# Altium footprint library MYLIB.PcbLib: 600 footprints (part 4 of 39) (continued)
## CP_56_1 [mil] (continued)
  text "*" at -150,112.8 h50
Mechanical 15:
  region: -141.95,-167.5 -167.5,-167.5 -167.5,-141.95 -179.5,-141.95 -179.5,141.95 -167.5,141.95 -167.5,167.5 -141.95,167.5 -141.95,179.5 141.95,179.5 141.95,167.5 167.5,167.5 167.5,141.95 179.5,141.95 179.5,-141.95 167.5,-141.95 167.5,-167.5 141.95,-167.5 141.95,-179.5 -141.95,-179.5
  lines w6: -179.5,-141.95 -167.5,-141.95 -167.5,-167.5 -141.95,-167.5 -141.95,-179.5 141.95,-179.5 141.95,-167.5 167.5,-167.5 167.5,-141.95 179.5,-141.95 179.5,141.95 167.5,141.95 167.5,167.5 141.95,167.5 141.95,179.5 -141.95,179.5 -141.95,167.5 -167.5,167.5 -167.5,141.95 -179.5,141.95 -179.5,-141.95
3D body: height 10, standoff 0, extent 0,0 10,10

## CP_56_1-L [mil]
pads (57):
  rect 28x8 smd paste+0 mask+0: 1(-151.5,127.95) 2(-151.5,108.27) 3(-151.5,88.58) 4(-151.5,68.9) 5(-151.5,49.21) 6(-151.5,29.53) 7(-151.5,9.84) 8(-151.5,-9.84) 9(-151.5,-29.53) 10(-151.5,-49.21) 11(-151.5,-68.9) 12(-151.5,-88.58) 13(-151.5,-108.27) 14(-151.5,-127.95) 29(151.5,-127.95) 30(151.5,-108.27) 31(151.5,-88.58) 32(151.5,-68.9) 33(151.5,-49.21) 34(151.5,-29.53) 35(151.5,-9.84) 36(151.5,9.84) 37(151.5,29.53) 38(151.5,49.21) 39(151.5,68.9) 40(151.5,88.58) 41(151.5,108.27) 42(151.5,127.95)
  rect 8x28 smd paste+0 mask+0: 15(-127.95,-151.5) 16(-108.27,-151.5) 17(-88.58,-151.5) 18(-68.9,-151.5) 19(-49.21,-151.5) 20(-29.53,-151.5) 21(-9.84,-151.5) 22(9.84,-151.5) 23(29.53,-151.5) 24(49.21,-151.5) 25(68.9,-151.5) 26(88.58,-151.5) 27(108.27,-151.5) 28(127.95,-151.5) 43(127.95,151.5) 44(108.27,151.5) 45(88.58,151.5) 46(68.9,151.5) 47(49.21,151.5) 48(29.53,151.5) 49(9.84,151.5) 50(-9.84,151.5) 51(-29.53,151.5) 52(-49.21,151.5) 53(-68.9,151.5) 54(-88.58,151.5) 55(-108.27,151.5) 56(-127.95,151.5)
  rect 220x220 smd paste-122.5 mask+0: 57(0,0)
Top Overlay:
  region: -2.34,175.5 -17.34,175.5 -17.34,185.5 -2.34,185.5
  region: 175.5,96.08 185.5,96.08 185.5,81.08 175.5,81.08
  region: 175.5,-100.77 185.5,-100.77 185.5,-115.77 175.5,-115.77
  region: -22.03,-175.5 -37.03,-175.5 -37.03,-185.5 -22.03,-185.5
  region: -175.5,-41.71 -185.5,-41.71 -185.5,-56.71 -175.5,-56.71
  lines w6: -162.5,-145.05 -162.5,-162.5 -145.05,-162.5 ; -162.5,145.05 -162.5,162.5 -145.05,162.5 ; 145.05,-162.5 162.5,-162.5 162.5,-145.05 ; 145.05,162.5 162.5,162.5 162.5,145.05
  text "*" at -203,112.8 h50
Top Paste:
  region: 119.06,-65.44 65.44,-65.44 65.44,-119.06 119.06,-119.06
  region: 119.06,-3.94 65.44,-3.94 65.44,-57.56 119.06,-57.56
  region: 119.06,57.56 65.44,57.56 65.44,3.94 119.06,3.94
  region: 119.06,119.06 65.44,119.06 65.44,65.44 119.06,65.44
  region: 57.56,-65.44 3.94,-65.44 3.94,-119.06 57.56,-119.06
  region: 57.56,-3.94 3.94,-3.94 3.94,-57.56 57.56,-57.56
  region: 57.56,57.56 3.94,57.56 3.94,3.94 57.56,3.94
  region: 57.56,119.06 3.94,119.06 3.94,65.44 57.56,65.44
  region: -3.94,-65.44 -57.56,-65.44 -57.56,-119.06 -3.94,-119.06
  region: -3.94,-3.94 -57.56,-3.94 -57.56,-57.56 -3.94,-57.56
  region: -3.94,57.56 -57.56,57.56 -57.56,3.94 -3.94,3.94
  region: -3.94,119.06 -57.56,119.06 -57.56,65.44 -3.94,65.44
  region: -65.44,-65.44 -119.06,-65.44 -119.06,-119.06 -65.44,-119.06
  region: -65.44,-3.94 -119.06,-3.94 -119.06,-57.56 -65.44,-57.56
  region: -65.44,57.56 -119.06,57.56 -119.06,3.94 -65.44,3.94
  region: -65.44,119.06 -119.06,119.06 -119.06,65.44 -65.44,65.44
Mechanical 5:
  region: 184.5,-184.5 -184.5,-184.5 -184.5,184.5 184.5,184.5
Mechanical 13:
  lines w1: -157.5,107.5 -107.5,157.5 ; -157.5,-157.5 -157.5,157.5 157.5,157.5 157.5,-157.5 -157.5,-157.5 ; -157.5,-133.95 -157.5,-121.95 -157.5,-133.95 ; -157.5,-114.27 -157.5,-102.27 -157.5,-114.27 ; -157.5,-94.58 -157.5,-82.58 -157.5,-94.58 ; -157.5,-74.9 -157.5,-62.9 -157.5,-74.9 ; -157.5,-55.21 -157.5,-43.21 -157.5,-55.21 ; -157.5,-35.53 -157.5,-23.53 -157.5,-35.53 ; -157.5,-15.84 -157.5,-3.84 -157.5,-15.84 ; -157.5,3.84 -157.5,15.84 -157.5,3.84 ; -157.5,23.53 -157.5,35.53 -157.5,23.53 ; -157.5,43.21 -157.5,55.21 -157.5,43.21 ; -157.5,62.9 -157.5,74.9 -157.5,62.9 ; -157.5,82.58 -157.5,94.58 -157.5,82.58 ; -157.5,102.27 -157.5,114.27 -157.5,102.27 ; -157.5,121.95 -157.5,133.95 -157.5,121.95 ; -133.95,-157.5 -121.95,-157.5 -133.95,-157.5 ; -133.95,157.5 -121.95,157.5 -133.95,157.5 ; -114.27,-157.5 -102.27,-157.5 -114.27,-157.5 ; -114.27,157.5 -102.27,157.5 -114.27,157.5 ; -94.58,-157.5 -82.58,-157.5 -94.58,-157.5 ; -94.58,157.5 -82.58,157.5 -94.58,157.5 ; -74.9,-157.5 -62.9,-157.5 -74.9,-157.5 ; -74.9,157.5 -62.9,157.5 -74.9,157.5 ; -55.21,-157.5 -43.21,-157.5 -55.21,-157.5 ; -55.21,157.5 -43.21,157.5 -55.21,157.5 ; -35.53,-157.5 -23.53,-157.5 -35.53,-157.5 ; -35.53,157.5 -23.53,157.5 -35.53,157.5 ; -15.84,-157.5 -3.84,-157.5 -15.84,-157.5 ; -15.84,157.5 -3.84,157.5 -15.84,157.5 ; 3.84,-157.5 15.84,-157.5 3.84,-157.5 ; 3.84,157.5 15.84,157.5 3.84,157.5 ; 23.53,-157.5 35.53,-157.5 23.53,-157.5 ; 23.53,157.5 35.53,157.5 23.53,157.5 ; 43.21,-157.5 55.21,-157.5 43.21,-157.5 ; 43.21,157.5 55.21,157.5 43.21,157.5 ; 62.9,-157.5 74.9,-157.5 62.9,-157.5 ; 62.9,157.5 74.9,157.5 62.9,157.5 ; 82.58,-157.5 94.58,-157.5 82.58,-157.5 ; 82.58,157.5 94.58,157.5 82.58,157.5 ; 102.27,-157.5 114.27,-157.5 102.27,-157.5 ; 102.27,157.5 114.27,157.5 102.27,157.5 ; 121.95,-157.5 133.95,-157.5 121.95,-157.5 ; 121.95,157.5 133.95,157.5 121.95,157.5 ; 157.5,-133.95 157.5,-121.95 157.5,-133.95 ; 157.5,-114.27 157.5,-102.27 157.5,-114.27 ; 157.5,-94.58 157.5,-82.58 157.5,-94.58 ; 157.5,-74.9 157.5,-62.9 157.5,-74.9 ; 157.5,-55.21 157.5,-43.21 157.5,-55.21 ; 157.5,-35.53 157.5,-23.53 157.5,-35.53 ; 157.5,-15.84 157.5,-3.84 157.5,-15.84 ; 157.5,3.84 157.5,15.84 157.5,3.84 ; 157.5,23.53 157.5,35.53 157.5,23.53 ; 157.5,43.21 157.5,55.21 157.5,43.21 ; 157.5,62.9 157.5,74.9 157.5,62.9 ; 157.5,82.58 157.5,94.58 157.5,82.58 ; 157.5,102.27 157.5,114.27 157.5,102.27 ; 157.5,121.95 157.5,133.95 157.5,121.95
  text "*" at -150,112.8 h50
Mechanical 15:
  region: -135.95,-161.5 -161.5,-161.5 -161.5,-135.95 -169.5,-135.95 -169.5,135.95 -161.5,135.95 -161.5,161.5 -135.95,161.5 -135.95,169.5 135.95,169.5 135.95,161.5 161.5,161.5 161.5,135.95 169.5,135.95 169.5,-135.95 161.5,-135.95 161.5,-161.5 135.95,-161.5 135.95,-169.5 -135.95,-169.5
  lines w6: -169.5,-135.95 -169.5,135.95 -161.5,135.95 -161.5,161.5 -135.95,161.5 -135.95,169.5 135.95,169.5 135.95,161.5 161.5,161.5 161.5,135.95 169.5,135.95 169.5,-135.95 161.5,-135.95 161.5,-161.5 135.95,-161.5 135.95,-169.5 -135.95,-169.5 -135.95,-161.5 -161.5,-161.5 -161.5,-135.95 -169.5,-135.95
3D body: height 10, standoff 0, extent 0,0 10,10

## CP_56_1-M [mil]
pads (57):
  rect 36x8 smd paste+0 mask+0: 1(-155.5,127.95) 2(-155.5,108.27) 3(-155.5,88.58) 4(-155.5,68.9) 5(-155.5,49.21) 6(-155.5,29.53) 7(-155.5,9.84) 8(-155.5,-9.84) 9(-155.5,-29.53) 10(-155.5,-49.21) 11(-155.5,-68.9) 12(-155.5,-88.58) 13(-155.5,-108.27) 14(-155.5,-127.95) 29(155.5,-127.95) 30(155.5,-108.27) 31(155.5,-88.58) 32(155.5,-68.9) 33(155.5,-49.21) 34(155.5,-29.53) 35(155.5,-9.84) 36(155.5,9.84) 37(155.5,29.53) 38(155.5,49.21) 39(155.5,68.9) 40(155.5,88.58) 41(155.5,108.27) 42(155.5,127.95)
  rect 8x36 smd paste+0 mask+0: 15(-127.95,-155.5) 16(-108.27,-155.5) 17(-88.58,-155.5) 18(-68.9,-155.5) 19(-49.21,-155.5) 20(-29.53,-155.5) 21(-9.84,-155.5) 22(9.84,-155.5) 23(29.53,-155.5) 24(49.21,-155.5) 25(68.9,-155.5) 26(88.58,-155.5) 27(108.27,-155.5) 28(127.95,-155.5) 43(127.95,155.5) 44(108.27,155.5) 45(88.58,155.5) 46(68.9,155.5) 47(49.21,155.5) 48(29.53,155.5) 49(9.84,155.5) 50(-9.84,155.5) 51(-29.53,155.5) 52(-49.21,155.5) 53(-68.9,155.5) 54(-88.58,155.5) 55(-108.27,155.5) 56(-127.95,155.5)
  rect 246x246 smd paste-122.5 mask+0: 57(0,0)
Top Overlay:
  region: -2.34,183.5 -17.34,183.5 -17.34,193.5 -2.34,193.5
  region: 183.5,96.08 193.5,96.08 193.5,81.08 183.5,81.08
  region: 183.5,-100.77 193.5,-100.77 193.5,-115.77 183.5,-115.77
  region: -22.03,-183.5 -37.03,-183.5 -37.03,-193.5 -22.03,-193.5
  region: -183.5,-41.71 -193.5,-41.71 -193.5,-56.71 -183.5,-56.71
  lines w6: -162.5,-145.05 -162.5,-162.5 -145.05,-162.5 ; -162.5,145.05 -162.5,162.5 -145.05,162.5 ; 145.05,-162.5 162.5,-162.5 162.5,-145.05 ; 145.05,162.5 162.5,162.5 162.5,145.05
  text "*" at -211,112.8 h50
Top Paste:
  region: 119.06,-65.44 65.44,-65.44 65.44,-119.06 119.06,-119.06
  region: 119.06,-3.94 65.44,-3.94 65.44,-57.56 119.06,-57.56
  region: 119.06,57.56 65.44,57.56 65.44,3.94 119.06,3.94
  region: 119.06,119.06 65.44,119.06 65.44,65.44 119.06,65.44
  region: 57.56,-65.44 3.94,-65.44 3.94,-119.06 57.56,-119.06
  region: 57.56,-3.94 3.94,-3.94 3.94,-57.56 57.56,-57.56
  region: 57.56,57.56 3.94,57.56 3.94,3.94 57.56,3.94
  region: 57.56,119.06 3.94,119.06 3.94,65.44 57.56,65.44
  region: -3.94,-65.44 -57.56,-65.44 -57.56,-119.06 -3.94,-119.06
  region: -3.94,-3.94 -57.56,-3.94 -57.56,-57.56 -3.94,-57.56
  region: -3.94,57.56 -57.56,57.56 -57.56,3.94 -3.94,3.94
  region: -3.94,119.06 -57.56,119.06 -57.56,65.44 -3.94,65.44
  region: -65.44,-65.44 -119.06,-65.44 -119.06,-119.06 -65.44,-119.06
  region: -65.44,-3.94 -119.06,-3.94 -119.06,-57.56 -65.44,-57.56
  region: -65.44,57.56 -119.06,57.56 -119.06,3.94 -65.44,3.94
  region: -65.44,119.06 -119.06,119.06 -119.06,65.44 -65.44,65.44
Mechanical 5:
  region: 208.5,-208.5 -208.5,-208.5 -208.5,208.5 208.5,208.5
Mechanical 13:
  lines w1: -157.5,107.5 -107.5,157.5 ; -157.5,-157.5 -157.5,157.5 157.5,157.5 157.5,-157.5 -157.5,-157.5 ; -157.5,-133.95 -157.5,-121.95 -157.5,-133.95 ; -157.5,-114.27 -157.5,-102.27 -157.5,-114.27 ; -157.5,-94.58 -157.5,-82.58 -157.5,-94.58 ; -157.5,-74.9 -157.5,-62.9 -157.5,-74.9 ; -157.5,-55.21 -157.5,-43.21 -157.5,-55.21 ; -157.5,-35.53 -157.5,-23.53 -157.5,-35.53 ; -157.5,-15.84 -157.5,-3.84 -157.5,-15.84 ; -157.5,3.84 -157.5,15.84 -157.5,3.84 ; -157.5,23.53 -157.5,35.53 -157.5,23.53 ; -157.5,43.21 -157.5,55.21 -157.5,43.21 ; -157.5,62.9 -157.5,74.9 -157.5,62.9 ; -157.5,82.58 -157.5,94.58 -157.5,82.58 ; -157.5,102.27 -157.5,114.27 -157.5,102.27 ; -157.5,121.95 -157.5,133.95 -157.5,121.95 ; -133.95,-157.5 -121.95,-157.5 -133.95,-157.5 ; -133.95,157.5 -121.95,157.5 -133.95,157.5 ; -114.27,-157.5 -102.27,-157.5 -114.27,-157.5 ; -114.27,157.5 -102.27,157.5 -114.27,157.5 ; -94.58,-157.5 -82.58,-157.5 -94.58,-157.5 ; -94.58,157.5 -82.58,157.5 -94.58,157.5 ; -74.9,-157.5 -62.9,-157.5 -74.9,-157.5 ; -74.9,157.5 -62.9,157.5 -74.9,157.5 ; -55.21,-157.5 -43.21,-157.5 -55.21,-157.5 ; -55.21,157.5 -43.21,157.5 -55.21,157.5 ; -35.53,-157.5 -23.53,-157.5 -35.53,-157.5 ; -35.53,157.5 -23.53,157.5 -35.53,157.5 ; -15.84,-157.5 -3.84,-157.5 -15.84,-157.5 ; -15.84,157.5 -3.84,157.5 -15.84,157.5 ; 3.84,-157.5 15.84,-157.5 3.84,-157.5 ; 3.84,157.5 15.84,157.5 3.84,157.5 ; 23.53,-157.5 35.53,-157.5 23.53,-157.5 ; 23.53,157.5 35.53,157.5 23.53,157.5 ; 43.21,-157.5 55.21,-157.5 43.21,-157.5 ; 43.21,157.5 55.21,157.5 43.21,157.5 ; 62.9,-157.5 74.9,-157.5 62.9,-157.5 ; 62.9,157.5 74.9,157.5 62.9,157.5 ; 82.58,-157.5 94.58,-157.5 82.58,-157.5 ; 82.58,157.5 94.58,157.5 82.58,157.5 ; 102.27,-157.5 114.27,-157.5 102.27,-157.5 ; 102.27,157.5 114.27,157.5 102.27,157.5 ; 121.95,-157.5 133.95,-157.5 121.95,-157.5 ; 121.95,157.5 133.95,157.5 121.95,157.5 ; 157.5,-133.95 157.5,-121.95 157.5,-133.95 ; 157.5,-114.27 157.5,-102.27 157.5,-114.27 ; 157.5,-94.58 157.5,-82.58 157.5,-94.58 ; 157.5,-74.9 157.5,-62.9 157.5,-74.9 ; 157.5,-55.21 157.5,-43.21 157.5,-55.21 ; 157.5,-35.53 157.5,-23.53 157.5,-35.53 ; 157.5,-15.84 157.5,-3.84 157.5,-15.84 ; 157.5,3.84 157.5,15.84 157.5,3.84 ; 157.5,23.53 157.5,35.53 157.5,23.53 ; 157.5,43.21 157.5,55.21 157.5,43.21 ; 157.5,62.9 157.5,74.9 157.5,62.9 ; 157.5,82.58 157.5,94.58 157.5,82.58 ; 157.5,102.27 157.5,114.27 157.5,102.27 ; 157.5,121.95 157.5,133.95 157.5,121.95
  text "*" at -150,112.8 h50
Mechanical 15:
  region: -151.95,-177.5 -177.5,-177.5 -177.5,-151.95 -193.5,-151.95 -193.5,151.95 -177.5,151.95 -177.5,177.5 -151.95,177.5 -151.95,193.5 151.95,193.5 151.95,177.5 177.5,177.5 177.5,151.95 193.5,151.95 193.5,-151.95 177.5,-151.95 177.5,-177.5 151.95,-177.5 151.95,-193.5 -151.95,-193.5
  lines w6: -193.5,-151.95 -193.5,151.95 -177.5,151.95 -177.5,177.5 -151.95,177.5 -151.95,193.5 151.95,193.5 151.95,177.5 177.5,177.5 177.5,151.95 193.5,151.95 193.5,-151.95 177.5,-151.95 177.5,-177.5 151.95,-177.5 151.95,-193.5 -151.95,-193.5 -151.95,-177.5 -177.5,-177.5 -177.5,-151.95 -193.5,-151.95
3D body: height 10, standoff 0, extent 0,0 10,10

## CSW1.27 SMD-2P [mm] "长：4.14mm，宽：5.4mm，高：2.3mm"
pads (4):
  rect 0.65x1.5 smd: 1(-0.635,-4.15) 2(0.635,-4.15) 3(0.635,4.15) 4(-0.635,4.15)
Top Overlay:
  circle w0.5: c-1.905,-4.064 r0.25
  region: -0.254,1.225 -1.016,1.225 -1.016,-0.045 -0.254,-0.045
  region: 1.016,1.225 0.254,1.225 0.254,-0.045 1.016,-0.045
  lines w0.15: -1.016,-0.045 -0.254,-0.045 ; 0.254,-0.045 1.016,-0.045 ; -1.016,-1.315 -0.254,-1.315 -0.254,1.225 -1.016,1.225 -1.016,-1.315 ; 0.254,-1.315 1.016,-1.315 1.016,1.225 0.254,1.225 0.254,-1.315
  lines w0.254: -2.07,-2.7 -2.07,2.7 2.07,2.7 2.07,-2.7 -2.07,-2.7
  text "ON" at -1.397,1.696 h1
Mechanical 13:
  circle w0.254: c-1.27,-1.905 r0.381
  lines w0.15: -2.032,-2.7 2.032,-2.7 2.032,2.7 -2.032,2.7 -2.032,-2.7
Mechanical 15:
  circle w0.05: c0,0 r0.35
  lines w0.05: -0.5,0 0.5,0 ; 0,-0.5 0,0.5
  lines w0.15: -2.286,-5.08 2.159,-5.08 2.286,-5.08 2.286,5.08 -2.286,5.08 -2.286,-5.08
3D body "CSW1.27-SMD-2P.STEP": height 2.35, standoff 0, extent -2.07,-4.35 2.07,4.35

## CSW1.27 SMD-3P [mm] "长：5.41mm，宽：5.4mm，高：2.3mm"
pads (6):
  rect 0.65x1.5 smd: 1(-1.27,-4.15) 2(0,-4.15) 3(1.27,-4.15) 4(1.27,4.15) 5(0,4.15) 6(-1.27,4.15)
Top Overlay:
  circle w0.5: c-2.54,-4.15 r0.25
  region: 1.651,1.225 0.889,1.225 0.889,-0.045 1.651,-0.045
  region: 0.381,1.184 -0.381,1.184 -0.381,-0.086 0.381,-0.086
  region: -0.889,1.225 -1.651,1.225 -1.651,-0.045 -0.889,-0.045
  lines w0.15: -1.651,-0.045 -0.889,-0.045 ; -0.381,-0.086 0.381,-0.086 ; 0.889,-0.045 1.651,-0.045 ; -1.651,-1.315 -1.651,1.225 -0.889,1.225 -0.889,-1.315 -1.651,-1.315 ; -0.381,-1.356 -0.381,1.184 0.381,1.184 0.381,-1.356 -0.381,-1.356 ; 0.889,-1.315 0.889,1.225 1.651,1.225 1.651,-1.315 0.889,-1.315
  lines w0.254: -2.667,-2.7 2.667,-2.7 2.667,2.7 -2.667,2.7 -2.667,-2.7
  text "ON" at -2.032,1.696 h1
Mechanical 13:
  circle w0.254: c-1.778,-1.819 r0.381
  lines w0.15: -2.667,-2.7 -2.667,2.7 2.705,2.7 2.705,-2.7 -2.667,-2.7
Mechanical 15:
  circle w0.05: c0,0 r0.35
  lines w0.05: -0.5,0 0.5,0 ; 0,-0.5 0,0.5
  lines w0.15: -2.921,-5.08 -2.921,5.08 2.921,5.08 2.921,-5.08 2.159,-5.08 -2.921,-5.08
3D body "CSW1.27-SMD-3P.STEP": height 2.35, standoff 0, extent -2.705,-4.35 2.705,4.35

## CSW1.27 SMD-4P [mm] "长：6.68mm，宽：5.4mm，高：2.3mm"
pads (8):
  rect 0.65x1.5 smd: 1(-1.905,-4.15) 2(-0.635,-4.15) 3(0.635,-4.15) 4(1.905,-4.15) 5(1.905,4.15) 6(0.635,4.15) 7(-0.635,4.15) 8(-1.905,4.15)
Top Overlay:
  circle w0.5: c-3.048,-4.105 r0.25
  region: 2.286,1.225 1.524,1.225 1.524,-0.045 2.286,-0.045
  region: 1.016,1.225 0.254,1.225 0.254,-0.045 1.016,-0.045
  region: -0.254,1.225 -1.016,1.225 -1.016,-0.045 -0.254,-0.045
  region: -1.524,1.225 -2.286,1.225 -2.286,-0.045 -1.524,-0.045
  lines w0.15: -2.286,-0.045 -1.524,-0.045 ; -1.016,-0.045 -0.254,-0.045 ; 0.254,-0.045 1.016,-0.045 ; 1.524,-0.045 2.286,-0.045 ; -2.286,-1.315 -2.286,1.225 -1.524,1.225 -1.524,-1.315 -2.286,-1.315 ; -1.016,-1.315 -1.016,1.225 -0.254,1.225 -0.254,-1.315 -1.016,-1.315 ; 0.254,-1.315 0.254,1.225 1.016,1.225 1.016,-1.315 0.254,-1.315 ; 1.524,-1.315 1.524,1.225 2.286,1.225 2.286,-1.315 1.524,-1.315
  lines w0.254: -3.175,-2.7 3.175,-2.7 3.175,2.7 -3.175,2.7 -3.175,-2.7
  text "ON" at -2.667,1.696 h1
Mechanical 13:
  circle w0.254: c-2.159,-1.819 r0.381
  lines w0.15: -3.429,-2.7 -3.429,2.7 3.429,2.7 3.429,-2.7 -3.429,-2.7
Mechanical 15:
  circle w0.05: c0,0 r0.35
  lines w0.05: -0.5,0 0.5,0 ; 0,-0.5 0,0.5
  lines w0.15: -3.683,-5.08 -3.683,5.08 3.683,5.08 3.683,-5.08 2.159,-5.08 -3.683,-5.08
3D body "CSW1.27-SMD-4P.STEP": height 2.35, standoff 0, extent -3.34,-4.35 3.34,4.35

## CSW1.27 SMD-5P [mm] "长：7.95mm，宽：5.4mm，高：2.3mm"
pads (10):
  rect 0.65x1.5 smd: 1(-2.54,-4.15) 2(-1.27,-4.15) 3(0,-4.15) 4(1.27,-4.15) 5(2.54,-4.15) 6(2.54,4.105) 7(1.27,4.105) 8(0,4.105) 9(-1.27,4.105) 10(-2.54,4.105)
Top Overlay:
  circle w0.5: c-3.683,-4.064 r0.25
  region: 0.381,1.27 -0.381,1.27 -0.381,0 0.381,0
  region: 2.921,1.27 2.159,1.27 2.159,0 2.921,0
  region: 1.651,1.27 0.889,1.27 0.889,0 1.651,0
  region: -0.889,1.27 -1.651,1.27 -1.651,0 -0.889,0
  region: -2.159,1.27 -2.921,1.27 -2.921,0 -2.159,0
  lines w0.15: -2.921,0 -2.159,0 ; -1.651,0 -0.889,0 ; -0.381,0 0.381,0 ; 0.889,0 1.651,0 ; 2.159,0 2.921,0 ; -2.921,-1.27 -2.921,1.27 -2.159,1.27 -2.159,-1.27 -2.921,-1.27 ; -1.651,-1.27 -1.651,1.27 -0.889,1.27 -0.889,-1.27 -1.651,-1.27 ; -0.381,-1.27 0.381,-1.27 0.381,1.27 -0.381,1.27 -0.381,-1.27 ; 0.889,-1.27 0.889,1.27 1.651,1.27 1.651,-1.27 0.889,-1.27 ; 2.159,-1.27 2.159,1.27 2.921,1.27 2.921,-1.27 2.159,-1.27
  lines w0.254: -3.81,-2.7 3.81,-2.7 3.81,2.7 -3.81,2.7 -3.81,-2.7
  text "ON" at -3.302,1.651 h1
Mechanical 13:
  circle w0.254: c-2.794,-1.819 r0.381
  lines w0.15: -3.937,-2.7 -3.937,2.7 3.937,2.7 3.937,-2.7 -3.937,-2.7
Mechanical 15:
  circle w0.05: c0,0 r0.35
  lines w0.05: -0.5,0 0.5,0 ; 0,-0.5 0,0.5
  lines w0.15: -4.191,-5.08 -4.191,5.08 4.191,5.08 4.191,-5.08 2.159,-5.08 -4.191,-5.08
3D body "CSW1.27-SMD-5P.STEP": height 2.35, standoff 0, extent -3.975,-4.35 3.975,4.35

## CSW1.27 SMD-6P [mm] "长：9.22mm，宽：5.4mm，高：2.3mm"
pads (12):
  rect 0.65x1.5 smd: 1(-3.175,-4.15) 2(-1.905,-4.15) 3(-0.635,-4.15) 4(0.635,-4.15) 5(1.905,-4.15) 6(3.175,-4.15) 7(3.175,4.105) 8(1.905,4.105) 9(0.635,4.105) 10(-0.635,4.105) 11(-1.905,4.105) 12(-3.175,4.105)
Top Overlay:
  circle w0.5: c-4.318,-4.064 r0.25
  region: -2.794,1.225 -3.556,1.225 -3.556,-0.045 -2.794,-0.045
  region: -1.524,1.225 -2.286,1.225 -2.286,-0.045 -1.524,-0.045
  region: -0.254,1.225 -1.016,1.225 -1.016,-0.045 -0.254,-0.045
  region: 1.016,1.225 0.254,1.225 0.254,-0.045 1.016,-0.045
  region: 2.286,1.225 1.524,1.225 1.524,-0.045 2.286,-0.045
  region: 3.556,1.225 2.794,1.225 2.794,-0.045 3.556,-0.045
  lines w0.15: -3.556,-0.045 -2.794,-0.045 ; -2.286,-0.045 -1.524,-0.045 ; -1.016,-0.045 -0.254,-0.045 ; 0.254,-0.045 1.016,-0.045 ; 1.524,-0.045 2.286,-0.045 ; 2.794,-0.045 3.556,-0.045 ; -3.556,-1.315 -2.794,-1.315 -2.794,1.225 -3.556,1.225 -3.556,-1.315 ; -2.286,-1.315 -1.524,-1.315 -1.524,1.225 -2.286,1.225 -2.286,-1.315 ; -1.016,-1.315 -0.254,-1.315 -0.254,1.225 -1.016,1.225 -1.016,-1.315 ; 0.254,-1.315 1.016,-1.315 1.016,1.225 0.254,1.225 0.254,-1.315 ; 1.524,-1.315 2.286,-1.315 2.286,1.225 1.524,1.225 1.524,-1.315 ; 2.794,-1.315 3.556,-1.315 3.556,1.225 2.794,1.225 2.794,-1.315
  lines w0.254: -4.445,-2.7 -4.445,2.7 4.445,2.7 4.445,-2.7 -4.445,-2.7
  text "ON" at -3.937,1.651 h1
Mechanical 13:
  circle w0.254: c-3.683,-1.905 r0.381
  lines w0.15: -4.572,-2.7 4.572,-2.7 4.572,2.7 -4.572,2.7 -4.572,-2.7
Mechanical 15:
  circle w0.05: c0,0 r0.35
  lines w0.05: -0.5,0 0.5,0 ; 0,-0.5 0,0.5
  lines w0.15: -4.826,-5.207 2.159,-5.207 4.826,-5.207 ; -4.826,-5.08 -4.826,5.207 4.826,5.207 4.826,-5.08
3D body "CSW1.27-SMD-6P.STEP": height 2.35, standoff 0, extent -4.61,-4.35 4.61,4.35

## CSW1.27 SMD-8P [mm] "长：11.76mm，宽：5.4mm，高：2.3mm"
pads (16):
  rect 0.65x1.5 smd: 1(-4.445,-4.15) 2(-3.175,-4.15) 3(-1.905,-4.15) 4(-0.635,-4.15) 5(0.635,-4.15) 6(1.905,-4.15) 7(3.175,-4.15) 8(4.445,-4.15) 9(4.445,4.105) 10(3.175,4.105) 11(1.905,4.105) 12(0.635,4.105) 13(-0.635,4.105) 14(-1.905,4.105) 15(-3.175,4.105) 16(-4.445,4.105)
Top Overlay:
  circle w0.5: c-5.588,-4.064 r0.25
  region: 4.826,1.225 4.064,1.225 4.064,-0.045 4.826,-0.045
  region: 3.556,1.225 2.794,1.225 2.794,-0.045 3.556,-0.045
  region: 2.286,1.225 1.524,1.225 1.524,-0.045 2.286,-0.045
  region: 1.016,1.225 0.254,1.225 0.254,-0.045 1.016,-0.045
  region: -0.254,1.225 -1.016,1.225 -1.016,-0.045 -0.254,-0.045
  region: -1.524,1.225 -2.286,1.225 -2.286,-0.045 -1.524,-0.045
  region: -2.794,1.225 -3.556,1.225 -3.556,-0.045 -2.794,-0.045
  region: -4.064,1.225 -4.826,1.225 -4.826,-0.045 -4.064,-0.045
  lines w0.15: -4.826,-0.045 -4.064,-0.045 ; -3.556,-0.045 -2.794,-0.045 ; -2.286,-0.045 -1.524,-0.045 ; -1.016,-0.045 -0.254,-0.045 ; 0.254,-0.045 1.016,-0.045 ; 1.524,-0.045 2.286,-0.045 ; 2.794,-0.045 3.556,-0.045 ; 4.064,-0.045 4.826,-0.045 ; -4.826,-1.315 -4.826,1.225 -4.064,1.225 -4.064,-1.315 -4.826,-1.315 ; -3.556,-1.315 -3.556,1.225 -2.794,1.225 -2.794,-1.315 -3.556,-1.315 ; -2.286,-1.315 -2.286,1.225 -1.524,1.225 -1.524,-1.315 -2.286,-1.315 ; -1.016,-1.315 -1.016,1.225 -0.254,1.225 -0.254,-1.315 -1.016,-1.315 ; 0.254,-1.315 0.254,1.225 1.016,1.225 1.016,-1.315 0.254,-1.315 ; 1.524,-1.315 1.524,1.225 2.286,1.225 2.286,-1.315 1.524,-1.315 ; 2.794,-1.315 2.794,1.225 3.556,1.225 3.556,-1.315 2.794,-1.315 ; 4.064,-1.315 4.064,1.225 4.826,1.225 4.826,-1.315 4.064,-1.315
  lines w0.254: -5.715,-2.7 5.715,-2.7 5.715,2.7 -5.715,2.7 -5.715,-2.7
  text "ON" at -5.08,1.651 h1
Mechanical 13:
  circle w0.254: c-4.953,-1.905 r0.381
  lines w0.15: -5.842,-2.7 -5.842,2.7 5.842,2.7 5.842,-2.7 -5.842,-2.7
Mechanical 15:
  circle w0.05: c0,0 r0.35
  lines w0.05: -0.5,0 0.5,0 ; 0,-0.5 0,0.5
  lines w0.15: 6.095,-5.21 -6.096,-5.21 -6.096,-5.207 -6.096,5.207 6.096,5.207 6.096,-5.21
3D body "CSW1.27-SMD-8P.STEP": height 2.35, standoff 0, extent -5.88,-4.35 5.88,4.35

## CSW1.27 SMD-10P [mm] "长：14.3mm，宽：5.4mm，高：2.3mm"
pads (20):
  rect 0.65x1.5 smd: 1(-5.715,-4.15) 2(-4.445,-4.15) 3(-3.175,-4.15) 4(-1.905,-4.15) 5(-0.635,-4.15) 6(0.635,-4.15) 7(1.905,-4.15) 8(3.175,-4.15) 9(4.445,-4.15) 10(5.715,-4.15) 11(5.715,4.105) 12(4.445,4.105) 13(3.175,4.105) 14(1.905,4.105) 15(0.635,4.105) 16(-0.635,4.105) 17(-1.905,4.105) 18(-3.175,4.105) 19(-4.445,4.105) 20(-5.715,4.105)
Top Overlay:
  circle w0.5: c-6.858,-4.064 r0.25
  region: -5.334,1.225 -6.096,1.225 -6.096,-0.045 -5.334,-0.045
  region: -4.064,1.225 -4.826,1.225 -4.826,-0.045 -4.064,-0.045
  region: -2.794,1.225 -3.556,1.225 -3.556,-0.045 -2.794,-0.045
  region: -1.524,1.225 -2.286,1.225 -2.286,-0.045 -1.524,-0.045
  region: -0.254,1.225 -1.016,1.225 -1.016,-0.045 -0.254,-0.045
  region: 1.016,1.225 0.254,1.225 0.254,-0.045 1.016,-0.045
  region: 2.286,1.225 1.524,1.225 1.524,-0.045 2.286,-0.045
  region: 3.556,1.225 2.794,1.225 2.794,-0.045 3.556,-0.045
  region: 4.826,1.225 4.064,1.225 4.064,-0.045 4.826,-0.045
  region: 6.096,1.225 5.334,1.225 5.334,-0.045 6.096,-0.045
  lines w0.15: -6.096,-0.045 -5.334,-0.045 ; -4.826,-0.045 -4.064,-0.045 ; -3.556,-0.045 -2.794,-0.045 ; -2.286,-0.045 -1.524,-0.045 ; -1.016,-0.045 -0.254,-0.045 ; 0.254,-0.045 1.016,-0.045 ; 1.524,-0.045 2.286,-0.045 ; 2.794,-0.045 3.556,-0.045 ; 4.064,-0.045 4.826,-0.045 ; 5.334,-0.045 6.096,-0.045 ; -6.096,-1.315 -5.334,-1.315 -5.334,1.225 -6.096,1.225 -6.096,-1.315 ; -4.826,-1.315 -4.064,-1.315 -4.064,1.225 -4.826,1.225 -4.826,-1.315 ; -3.556,-1.315 -2.794,-1.315 -2.794,1.225 -3.556,1.225 -3.556,-1.315 ; -2.286,-1.315 -1.524,-1.315 -1.524,1.225 -2.286,1.225 -2.286,-1.315 ; -1.016,-1.315 -0.254,-1.315 -0.254,1.225 -1.016,1.225 -1.016,-1.315 ; 0.254,-1.315 1.016,-1.315 1.016,1.225 0.254,1.225 0.254,-1.315 ; 1.524,-1.315 2.286,-1.315 2.286,1.225 1.524,1.225 1.524,-1.315 ; 2.794,-1.315 3.556,-1.315 3.556,1.225 2.794,1.225 2.794,-1.315 ; 4.064,-1.315 4.826,-1.315 4.826,1.225 4.064,1.225 4.064,-1.315 ; 5.334,-1.315 6.096,-1.315 6.096,1.225 5.334,1.225 5.334,-1.315
  lines w0.254: -6.985,-2.7 6.985,-2.7 6.985,2.7 -6.985,2.7 -6.985,-2.7
  text "ON" at -6.477,1.651 h1
Mechanical 13:
  circle w0.254: c-6.223,-1.905 r0.381
  lines w0.15: -7.112,-2.7 -7.112,2.7 7.15,2.7 7.15,-2.7 -7.112,-2.7
Mechanical 15:
  circle w0.05: c0,0 r0.35
  lines w0.05: -0.5,0 0.5,0 ; 0,-0.5 0,0.5
  lines w0.15: -7.366,-5.207 -7.366,5.207 7.366,5.207 7.366,-5.207 -7.366,-5.207
3D body "CSW1.27-SMD-10P.STEP": height 2.35, standoff 0, extent -7.15,-4.35 7.15,4.35

## CSW DIP-1P [mm] "4.1*9.9*7mm"
pads (2):
  rect 1.7x1.7 hole 0.9: 1(0,-3.81)
  round 1.7 hole 0.9: 2(0,3.81)
Top Overlay:
  rectangle: -0.508,0.127 0.508,1.651
  lines w0.127: -0.508,0.127 0.508,0.127 ; -0.508,-1.905 -0.508,1.651 0.508,1.651 0.508,-1.905 -0.508,-1.905
  lines w0.2: -2.159,-5.08 -2.159,4.953 2.159,4.953 2.159,-5.08 -2.159,-5.08
  text "ON" at -1.016,1.778 h1.52
Mechanical 15:
  circle w0.05: c0,0 r0.35
  lines w0.05: -0.5,0 0.5,0 ; 0,-0.5 0,0.5
3D body "CSW DIP-1P.STEP": height 6.65, standoff -3.15, extent -2.05,-4.95 2.05,4.95